# Altium footprint library разъёмы.PcbLib: 129 footprints (part 4 of 9)
Each footprint in its own frame and in the unit in brackets; x right, y up, seen from the top. Pads: shape width x height; smd on the part's side, far side on the other; paste and mask are expansions set on the pad; w line width, h text height; cw(c..) or ccw(c..) is an arc to the next point about the centre after c.
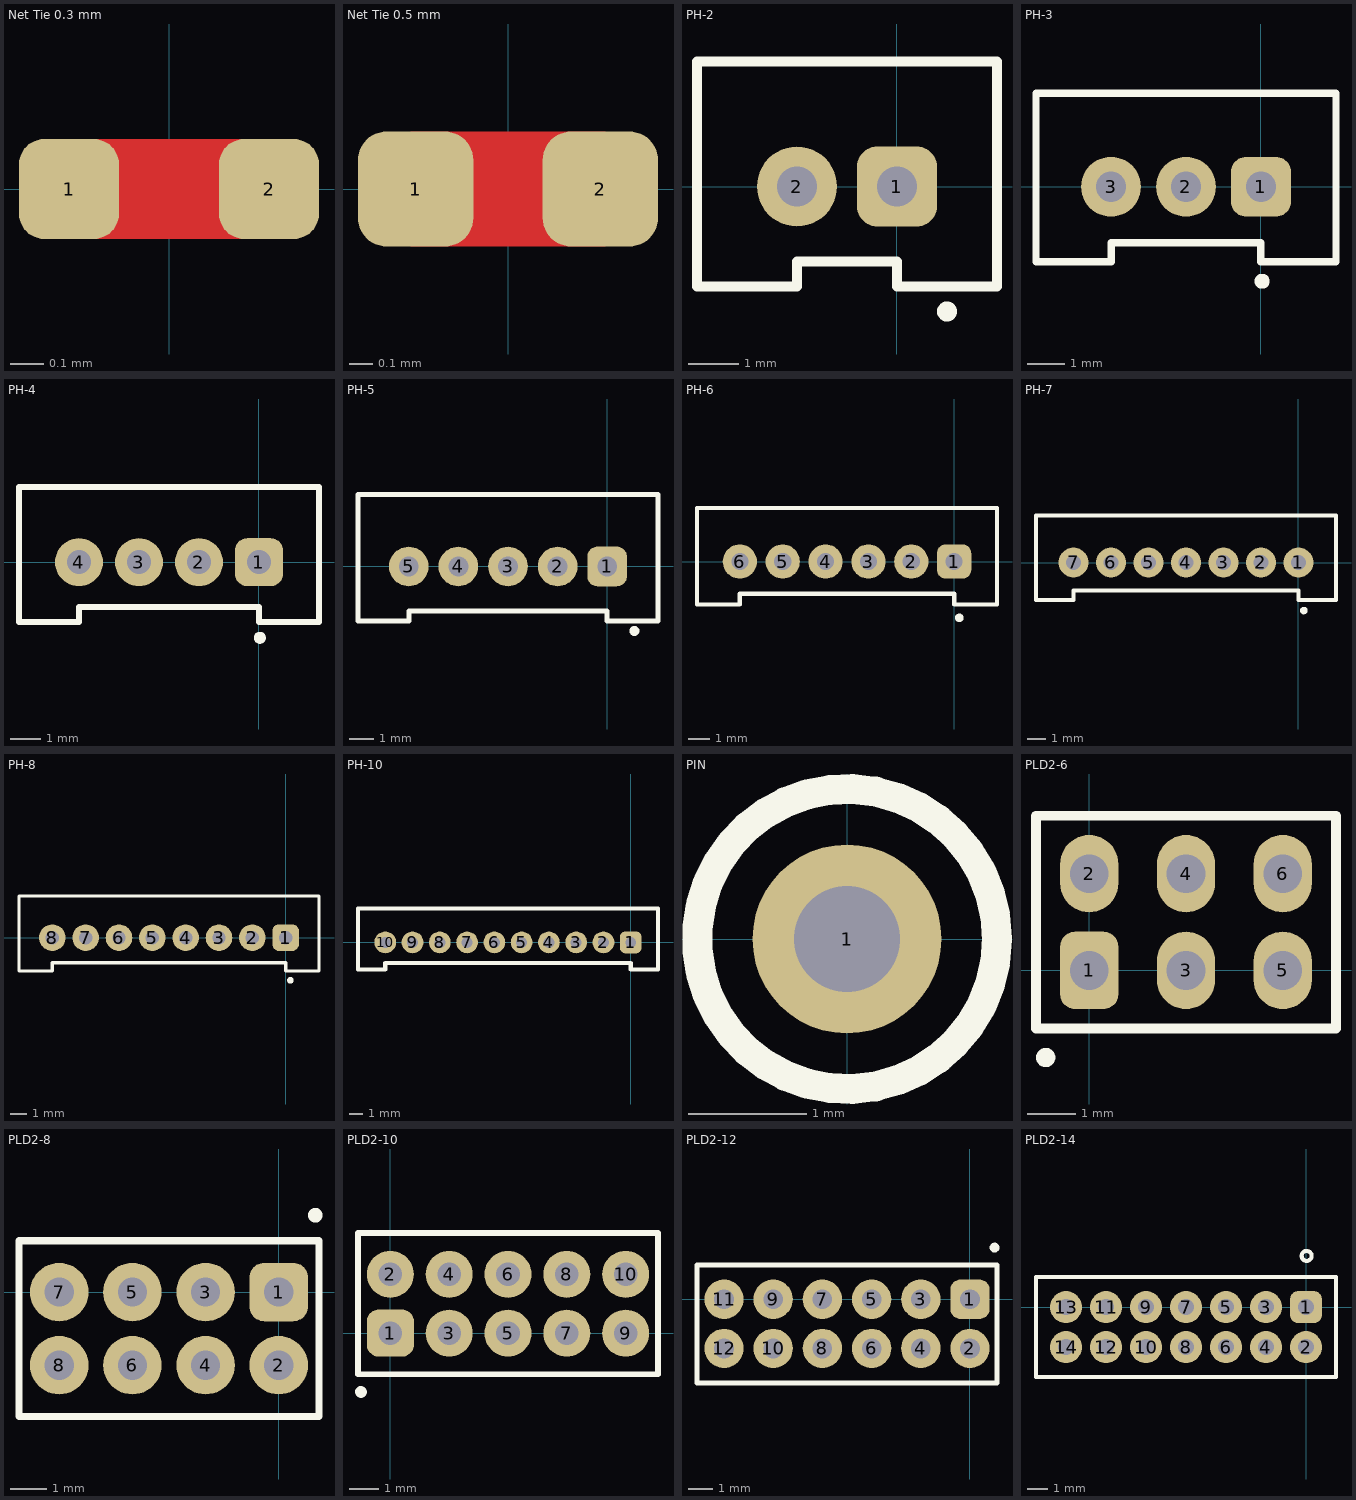
[diagram p3: the footprints below, top view; thin cyan lines are the x and y axes]

## Net Tie 0.3 mm [mm] "Перемычка для 2 разных сигналов S=0.3 мм"
pads (2):
  rrect50% 0.3x0.3 smd mask+0.05: 1(-0.3,0) 2(0.3,0)
Top Layer:
  lines w0.3: -0.3,0 0.3,0

## Net Tie 0.5 mm [mm] "Перемычка для 2 разных сигналов S=0.5 мм"
pads (2):
  rrect50% 0.5x0.5 smd mask+0.05: 1(-0.4,0) 2(0.4,0)
Top Layer:
  lines w0.5: -0.4,0 0.4,0

## PH-2 [mm]
pads (2):
  rrect50% 1.6x1.6 hole 0.8 mask+0.025: 1(0,0)
  round 1.6 hole 0.8 mask+0.025: 2(-2,0)
Top Overlay:
  circle w0.2: c1,-2.5 r0.1
  lines w0.2: -4,-2 -2,-2 -2,-1.5 0,-1.5 0,-2 2,-2 2,2.5 -4,2.5 -4,-2
3D body "User Library-b2b-ph-ks-1.SLDPRT": height 6, standoff -3, extent -3.95,-1.7 1.95,2.8

## PH-3 [mm]
pads (3):
  rrect50% 1.6x1.6 hole 0.8: 1(0,0)
  round 1.6 hole 0.8: 2(-2,0) 3(-4,0)
Top Overlay:
  circle w0.2: c0.03,-2.52 r0.1
  lines w0.2: -6,-2 -4,-2 -4,-1.5 0,-1.5 0,-2 2,-2 2,2.5 -6,2.5 -6,-2
3D body "User Library-B3B-PH-K-S(LF)(SN).SLDPRT": height 6, standoff -3.4, extent -5.95,-1.7 1.95,2.8

## PH-4 [mm]
pads (4):
  rrect50% 1.6x1.6 hole 0.8: 1(0,0)
  round 1.6 hole 0.8: 2(-2,0) 3(-4,0) 4(-6,0)
Top Overlay:
  circle w0.2: c0.03,-2.52 r0.1
  lines w0.2: -8,-2 -8,2.5 2,2.5 2,-2 0,-2 0,-1.5 -6,-1.5 -6,-2 -8,-2
3D body "User Library-b4b-ph-k-s.SLDPRT": height 6, standoff -3, extent -7.947,-1.691 1.953,2.809

## PH-5 [mm]
pads (5):
  rrect50% 1.6x1.6 hole 0.8 mask+0.025: 1(0,0)
  round 1.6 hole 0.8 mask+0.025: 2(-2,0) 3(-4,0) 4(-6,0) 5(-8,0)
Top Overlay:
  circle w0.2: c1.1,-2.6 r0.1
  lines w0.2: -10.05,-2.2 -8,-2.2 -8,-1.8 0,-1.8 0,-2.2 2.05,-2.2 2.05,2.9 -10.05,2.9 -10.05,-2.2
3D body "User Library-B5B-PH-K-S(LF)(SN).SLDPRT": height 6, standoff -3.4, extent -9.95,-1.7 1.95,2.8

## PH-6 [mm]
pads (6):
  rrect50% 1.6x1.6 hole 0.8: 1(0,0)
  round 1.6 hole 0.8: 2(-2,0) 3(-4,0) 4(-6,0) 5(-8,0) 6(-10,0)
Top Overlay:
  circle w0.2: c0.238,-2.627 r0.1
  lines w0.2: -12,-2 -10,-2 -10,-1.5 0,-1.5 0,-2 2,-2 2,2.5 -12,2.5 -12,-2
3D body "User Library-b6b-ph-ks.SLDPRT": height 6, standoff -3, extent -11.95,-1.7 1.95,2.8

## PH-7 [mm]
pads (7):
  round 1.6 hole 0.8: 1(0.004,0.003) 2(-1.996,0.003) 3(-3.996,0.003) 4(-5.996,0.003) 5(-7.996,0.003) 6(-9.996,0.003) 7(-11.996,0.003)
Top Overlay:
  circle w0.2: c0.284,-2.56 r0.1
  lines w0.2: -13.996,-1.997 -11.996,-1.997 -11.996,-1.497 0.004,-1.497 0.004,-1.997 2.004,-1.997 2.004,2.503 -13.996,2.503 -13.996,-1.997

## PH-8 [mm]
pads (8):
  rrect50% 1.6x1.6 hole 0.8: 1(0,0)
  round 1.6 hole 0.8: 2(-2,0) 3(-4,0) 4(-6,0) 5(-8,0) 6(-10,0) 7(-12,0) 8(-14,0)
Top Overlay:
  circle w0.2: c0.284,-2.56 r0.1
  lines w0.2: -16,-2 -14,-2 -14,-1.5 0,-1.5 0,-2 2,-2 2,2.5 -16,2.5 -16,-2

## PH-10 [mm]
pads (10):
  rrect50% 1.6x1.6 hole 0.8: 1(0,0)
  round 1.6 hole 0.8: 2(-2,0) 3(-4,0) 4(-6,0) 5(-8,0) 6(-10,0) 7(-12,0) 8(-14,0) 9(-16,0) 10(-18,0)
Top Overlay:
  lines w0.3: -20,-2 -18,-2 -18,-1.5 0,-1.5 0,-2 2,-2 2,2.5 -20,2.5 -20,-2

## PIN [mm]
pads (1):
  round 1.6 hole 0.9: 1(0,0)
Top Overlay:
  circle w0.254: c0,0 r1.27
3D body "pin mill-max-0956-0-15-20-75-14-11-0.SLDPRT": height 6.05, standoff -2.89, extent -0.922,-0.913 0.9,0.913

## PLD2-6 [mm]
pads (6):
  rrect50% 1.2x1.6 hole 0.8 mask+0.025: 1(0,0)
  oval 1.2x1.6 hole 0.8 mask+0.025: 2(0,2) 3(2,0) 4(2,2) 5(4,0) 6(4,2)
Top Overlay:
  circle w0.2: c-0.9,-1.8 r0.1
  lines w0.2: -1.1,-1.2 5.1,-1.2 5.1,3.2 -1.1,3.2 -1.1,-1.2
3D body "User Library-PLD2-6.SLDPRT": height 5.5, standoff -2.6, extent -1,-1.1 5,3.1

## PLD2-8 [mm]
pads (8):
  rrect50% 1.6x1.6 hole 0.8 mask+0.025: 1(0,0)
  round 1.6 hole 0.8 mask+0.025: 2(0,-2) 3(-2,0) 4(-2,-2) 5(-4,0) 6(-4,-2) 7(-6,0) 8(-6,-2)
Top Overlay:
  circle w0.2: c1,2.1 r0.1
  lines w0.2: -7.1,-3.4 -7.1,1.4 1.1,1.4 1.1,-3.4 -7.1,-3.4
3D body "User Library-PLD2-2.SLDPRT": height 5.5, standoff -2.5, extent -7,-3.3 -5,1.3
3D body "User Library-PLD2-2.SLDPRT": height 5.5, standoff -2.5, extent -5,-3.3 -3,1.3
3D body "User Library-PLD2-2.SLDPRT": height 5.5, standoff -2.5, extent -3,-3.3 -1,1.3
3D body "User Library-PLD2-2.SLDPRT": height 5.5, standoff -2.5, extent -1,-3.3 1,1.3

## PLD2-10 [mm]
pads (10):
  rrect50% 1.6x1.6 hole 0.8 mask+0.025: 1(0,0)
  round 1.6 hole 0.8 mask+0.025: 2(0,2) 3(2,0) 4(2,2) 5(4,0) 6(4,2) 7(6,0) 8(6,2) 9(8,0) 10(8,2)
Top Overlay:
  circle w0.2: c-1,-2 r0.1
  lines w0.2: -1.1,-1.4 9.1,-1.4 9.1,3.4 -1.1,3.4 -1.1,-1.4
3D body "User Library-PLD2-10.sldprt": height 5.5, standoff -2.5, extent -1,-1.3 9,3.3

## PLD2-12 [mm]
pads (12):
  rrect50% 1.6x1.6 hole 0.8 mask+0.025: 1(0,0)
  round 1.6 hole 0.8 mask+0.025: 2(0,-2) 3(-2,0) 4(-2,-2) 5(-4,0) 6(-4,-2) 7(-6,0) 8(-6,-2) 9(-8,0) 10(-8,-2) 11(-10,0) 12(-10,-2)
Top Overlay:
  circle w0.2: c1,2.1 r0.1
  lines w0.2: -11.1,-3.4 1.1,-3.4 1.1,1.4 -11.1,1.4 -11.1,-3.4
3D body "User Library-PLD2-2.SLDPRT": height 5.5, standoff -2.5, extent -11,-3.3 -9,1.3
3D body "User Library-PLD2-10.SLDPRT": height 5.5, standoff -2.5, extent -9.025,-3.3 0.975,1.3

## PLD2-14 [mm]
pads (14):
  rrect50% 1.6x1.6 hole 0.8: 1(0,0)
  round 1.6 hole 0.8: 2(0,-2) 3(-2,0) 4(-2,-2) 5(-4,0) 6(-4,-2) 7(-6,0) 8(-6,-2) 9(-8,0) 10(-8,-2) 11(-10,0) 12(-10,-2) 13(-12,0) 14(-12,-2)
Top Overlay:
  circle w0.2: c0.03,2.56 r0.25
  lines w0.2: -13.5,-3.5 1.5,-3.5 1.5,1.5 -13.5,1.5 -13.5,-3.5